# Altium integrated library Lattice CPLD ispLSI.IntLib: 471 symbols (part 3 of 26)
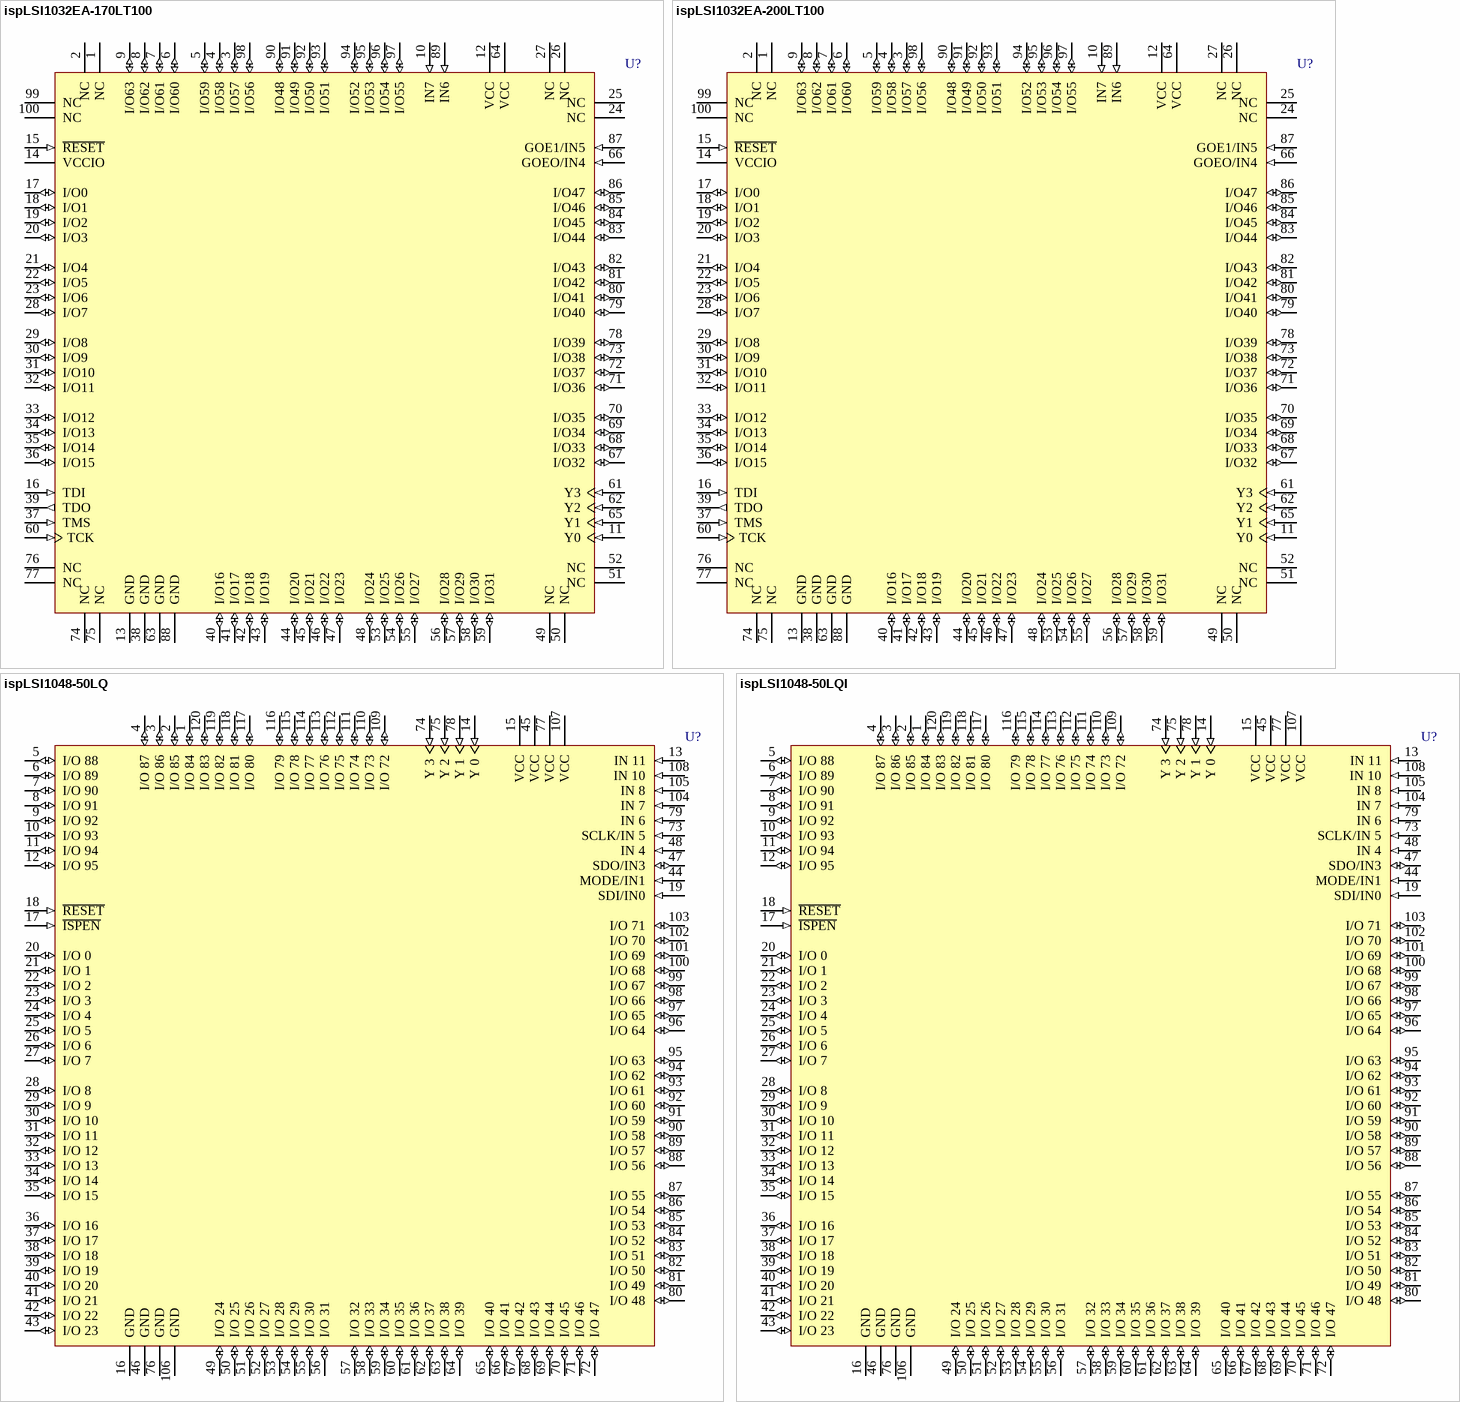
[diagram p233: symbols ispLSI1032EA-170LT100 to ispLSI1048-50LQI]

## ispLSI1032EA-200LT100
designator U?
In-System Programmable High-Density PLD; Note: Pins 66 and 87 have dual function capability which is software selectable.; Published: 23-Sep-2002; LatestRevisionDate: 13-Apr-2006; LatestRevisionNote: IPC-7351 Footprint Added.; DatasheetVersion: Jun-2000; PackageVersion: pkg_32, Aug-2005; PackageReference: TQFP100; Publisher: Altium Limited; PackageDescription: 100-Pin Thin Quad Flat Pack (TQFP100); Code_JEDEC: MS-026-BED; ComponentLink1Description: Manufacturer Link; ComponentLink1URL: http://www.latticesemi.com/products/mature/index.cfm; ComponentLink2Description: Datasheet; ComponentLink2URL: http://www.latticesemi.com/lit/docs/datasheets/cpld/1032ea.pdf
footprint TQFP100_N (Thin QFP, 100-Leads, Body 14x14mm, Pitch 0.5mm, IPC Medium Density)
footprint TQFP100_L (Thin QFP, 100-Leads, Body 14x14mm, Pitch 0.5mm, IPC High Density)
footprint TQFP100_M (Thin QFP, 100-Leads, Body 14x14mm, Pitch 0.5mm, IPC Low Density)
3D model 1032EA-TQFP100 (100-Pin Thin Quad Flat Pack (TQFP100))
pins: 1 NC, 2 NC, 3 I/O57 (io), 4 I/O58 (io), 5 I/O59 (io), 6 I/O60 (io), 7 I/O61 (io), 8 I/O62 (io), 9 I/O63 (io), 10 IN7 (in), 11 Y0 (in), 12 VCC (power), 13 GND (power), 14 VCCIO (power), 15 ~{RESET} (in), 16 TDI (in), 17 I/O0 (io), 18 I/O1 (io), 19 I/O2 (io), 20 I/O3 (io), 21 I/O4 (io), 22 I/O5 (io), 23 I/O6 (io), 24 NC, 25 NC, 26 NC, 27 NC, 28 I/O7 (io), 29 I/O8 (io), 30 I/O9 (io), 31 I/O10 (io), 32 I/O11 (io), 33 I/O12 (io), 34 I/O13 (io), 35 I/O14 (io), 36 I/O15 (io), 37 TMS (in), 38 GND (power), 39 TDO (out), 40 I/O16 (io), 41 I/O17 (io), 42 I/O18 (io), 43 I/O19 (io), 44 I/O20 (io), 45 I/O21 (io), 46 I/O22 (io), 47 I/O23 (io), 48 I/O24 (io), 49 NC, 50 NC, 51 NC, 52 NC, 53 I/O25 (io), 54 I/O26 (io), 55 I/O27 (io), 56 I/O28 (io), 57 I/O29 (io), 58 I/O30 (io), 59 I/O31 (io), 60 TCK (in), 61 Y3 (in), 62 Y2 (in), 63 GND (power), 64 VCC (power), 65 Y1 (in), 66 GOEO/IN4 (in), 67 I/O32 (io), 68 I/O33 (io), 69 I/O34 (io), 70 I/O35 (io), 71 I/O36 (io), 72 I/O37 (io), 73 I/O38 (io), 74 NC, 75 NC, 76 NC, 77 NC, 78 I/O39 (io), 79 I/O40 (io), 80 I/O41 (io), 81 I/O42 (io), 82 I/O43 (io), 83 I/O44 (io), 84 I/O45 (io), 85 I/O46 (io), 86 I/O47 (io), 87 GOE1/IN5 (in), 88 GND (power), 89 IN6 (in), 90 I/O48 (io), 91 I/O49 (io), 92 I/O50 (io), 93 I/O51 (io), 94 I/O52 (io), 95 I/O53 (io), 96 I/O54 (io), 97 I/O55 (io), 98 I/O56 (io), 99 NC, 100 NC

## ispLSI1048-50LQ
designator U?
High-Density Programmable Logic; Published: 8-Jun-2000; LatestRevisionDate: 13-Apr-2006; LatestRevisionNote: IPC-7351 Footprint Added.; DatasheetVersion: Feb-1997; PackageVersion: pkg_32, Aug-2005; PackageReference: PQFP120; Publisher: Altium Limited; PackageDescription: 120-Pin Quad Flat Pack 0.8 mm Pitch; Code_IPC: QFP80P3120X3120-120; ComponentLink1Description: Manufacturer Link; ComponentLink1URL: http://www.latticesemi.com/products/mature/index.cfm; ComponentLink2Description: Datasheet; ComponentLink2URL: http://www.latticesemi.com/lit/docs/datasheets/cpld/1048.pdf
footprint PQFP120_N (QFP, 120-Leads, Body 28x28mm, Pitch 0.8mm, IPC Medium Density)
footprint PQFP120_L (QFP, 120-Leads, Body 28x28mm, Pitch 0.8mm, IPC High Density)
footprint PQFP120_M (QFP, 120-Leads, Body 28x28mm, Pitch 0.8mm, IPC Low Density)
3D model 1048-PQFP120 (120-Pin Quad Flat Pack 0.8 mm Pitch)
pins: 1 I/O 84 (io), 2 I/O 85 (io), 3 I/O 86 (io), 4 I/O 87 (io), 5 I/O 88 (io), 6 I/O 89 (io), 7 I/O 90 (io), 8 I/O 91 (io), 9 I/O 92 (io), 10 I/O 93 (io), 11 I/O 94 (io), 12 I/O 95 (io), 13 IN 11 (in), 14 Y 0 (in), 15 VCC (power), 16 GND (power), 17 ~{ISPEN} (in), 18 ~{RESET} (in), 19 SDI/IN0 (in), 20 I/O 0 (io), 21 I/O 1 (io), 22 I/O 2 (io), 23 I/O 3 (io), 24 I/O 4 (io), 25 I/O 5 (io), 26 I/O 6 (io), 27 I/O 7 (io), 28 I/O 8 (io), 29 I/O 9 (io), 30 I/O 10 (io), 31 I/O 11 (io), 32 I/O 12 (io), 33 I/O 13 (io), 34 I/O 14 (io), 35 I/O 15 (io), 36 I/O 16 (io), 37 I/O 17 (io), 38 I/O 18 (io), 39 I/O 19 (io), 40 I/O 20 (io), 41 I/O 21 (io), 42 I/O 22 (io), 43 I/O 23 (io), 44 MODE/IN1 (in), 45 VCC (power), 46 GND (power), 47 SDO/IN3 (io), 48 IN 4 (in), 49 I/O 24 (io), 50 I/O 25 (io), 51 I/O 26 (io), 52 I/O 27 (io), 53 I/O 28 (io), 54 I/O 29 (io), 55 I/O 30 (io), 56 I/O 31 (io), 57 I/O 32 (io), 58 I/O 33 (io), 59 I/O 34 (io), 60 I/O 35 (io), 61 I/O 36 (io), 62 I/O 37 (io), 63 I/O 38 (io), 64 I/O 39 (io), 65 I/O 40 (io), 66 I/O 41 (io), 67 I/O 42 (io), 68 I/O 43 (io), 69 I/O 44 (io), 70 I/O 45 (io), 71 I/O 46 (io), 72 I/O 47 (io), 73 SCLK/IN 5 (in), 74 Y 3 (in), 75 Y 2 (in), 76 GND (power), 77 VCC (power), 78 Y 1 (in), 79 IN 6 (in), 80 I/O 48 (io), 81 I/O 49 (io), 82 I/O 50 (io), 83 I/O 51 (io), 84 I/O 52 (io), 85 I/O 53 (io), 86 I/O 54 (io), 87 I/O 55 (io), 88 I/O 56 (io), 89 I/O 57 (io), 90 I/O 58 (io), 91 I/O 59 (io), 92 I/O 60 (io), 93 I/O 61 (io), 94 I/O 62 (io), 95 I/O 63 (io), 96 I/O 64 (io), 97 I/O 65 (io), 98 I/O 66 (io), 99 I/O 67 (io), 100 I/O 68 (io), 101 I/O 69 (io), 102 I/O 70 (io), 103 I/O 71 (io), 104 IN 7 (in), 105 IN 8 (in), 106 GND (power), 107 VCC (power), 108 IN 10 (in), 109 I/O 72 (io), 110 I/O 73 (io), 111 I/O 74 (io), 112 I/O 75 (io), 113 I/O 76 (io), 114 I/O 77 (io), 115 I/O 78 (io), 116 I/O 79 (io), 117 I/O 80 (io), 118 I/O 81 (io), 119 I/O 82 (io), 120 I/O 83 (io)

## ispLSI1048-50LQI
designator U?
High-Density Programmable Logic; Published: 8-Jun-2000; LatestRevisionDate: 13-Apr-2006; LatestRevisionNote: IPC-7351 Footprint Added.; DatasheetVersion: Feb-1997; PackageVersion: pkg_32, Aug-2005; PackageReference: PQFP120; Publisher: Altium Limited; PackageDescription: 120-Pin Quad Flat Pack 0.8 mm Pitch; Code_IPC: QFP80P3120X3120-120; ComponentLink1Description: Manufacturer Link; ComponentLink1URL: http://www.latticesemi.com/products/mature/index.cfm; ComponentLink2Description: Datasheet; ComponentLink2URL: http://www.latticesemi.com/lit/docs/datasheets/cpld/1048.pdf
footprint PQFP120_N (QFP, 120-Leads, Body 28x28mm, Pitch 0.8mm, IPC Medium Density)
footprint PQFP120_L (QFP, 120-Leads, Body 28x28mm, Pitch 0.8mm, IPC High Density)
footprint PQFP120_M (QFP, 120-Leads, Body 28x28mm, Pitch 0.8mm, IPC Low Density)
3D model 1048-PQFP120 (120-Pin Quad Flat Pack 0.8 mm Pitch)
pins: 1 I/O 84 (io), 2 I/O 85 (io), 3 I/O 86 (io), 4 I/O 87 (io), 5 I/O 88 (io), 6 I/O 89 (io), 7 I/O 90 (io), 8 I/O 91 (io), 9 I/O 92 (io), 10 I/O 93 (io), 11 I/O 94 (io), 12 I/O 95 (io), 13 IN 11 (in), 14 Y 0 (in), 15 VCC (power), 16 GND (power), 17 ~{ISPEN} (in), 18 ~{RESET} (in), 19 SDI/IN0 (in), 20 I/O 0 (io), 21 I/O 1 (io), 22 I/O 2 (io), 23 I/O 3 (io), 24 I/O 4 (io), 25 I/O 5 (io), 26 I/O 6 (io), 27 I/O 7 (io), 28 I/O 8 (io), 29 I/O 9 (io), 30 I/O 10 (io), 31 I/O 11 (io), 32 I/O 12 (io), 33 I/O 13 (io), 34 I/O 14 (io), 35 I/O 15 (io), 36 I/O 16 (io), 37 I/O 17 (io), 38 I/O 18 (io), 39 I/O 19 (io), 40 I/O 20 (io), 41 I/O 21 (io), 42 I/O 22 (io), 43 I/O 23 (io), 44 MODE/IN1 (in), 45 VCC (power), 46 GND (power), 47 SDO/IN3 (io), 48 IN 4 (in), 49 I/O 24 (io), 50 I/O 25 (io), 51 I/O 26 (io), 52 I/O 27 (io), 53 I/O 28 (io), 54 I/O 29 (io), 55 I/O 30 (io), 56 I/O 31 (io), 57 I/O 32 (io), 58 I/O 33 (io), 59 I/O 34 (io), 60 I/O 35 (io), 61 I/O 36 (io), 62 I/O 37 (io), 63 I/O 38 (io), 64 I/O 39 (io), 65 I/O 40 (io), 66 I/O 41 (io), 67 I/O 42 (io), 68 I/O 43 (io), 69 I/O 44 (io), 70 I/O 45 (io), 71 I/O 46 (io), 72 I/O 47 (io), 73 SCLK/IN 5 (in), 74 Y 3 (in), 75 Y 2 (in), 76 GND (power), 77 VCC (power), 78 Y 1 (in), 79 IN 6 (in), 80 I/O 48 (io), 81 I/O 49 (io), 82 I/O 50 (io), 83 I/O 51 (io), 84 I/O 52 (io), 85 I/O 53 (io), 86 I/O 54 (io), 87 I/O 55 (io), 88 I/O 56 (io), 89 I/O 57 (io), 90 I/O 58 (io), 91 I/O 59 (io), 92 I/O 60 (io), 93 I/O 61 (io), 94 I/O 62 (io), 95 I/O 63 (io), 96 I/O 64 (io), 97 I/O 65 (io), 98 I/O 66 (io), 99 I/O 67 (io), 100 I/O 68 (io), 101 I/O 69 (io), 102 I/O 70 (io), 103 I/O 71 (io), 104 IN 7 (in), 105 IN 8 (in), 106 GND (power), 107 VCC (power), 108 IN 10 (in), 109 I/O 72 (io), 110 I/O 73 (io), 111 I/O 74 (io), 112 I/O 75 (io), 113 I/O 76 (io), 114 I/O 77 (io), 115 I/O 78 (io), 116 I/O 79 (io), 117 I/O 80 (io), 118 I/O 81 (io), 119 I/O 82 (io), 120 I/O 83 (io)

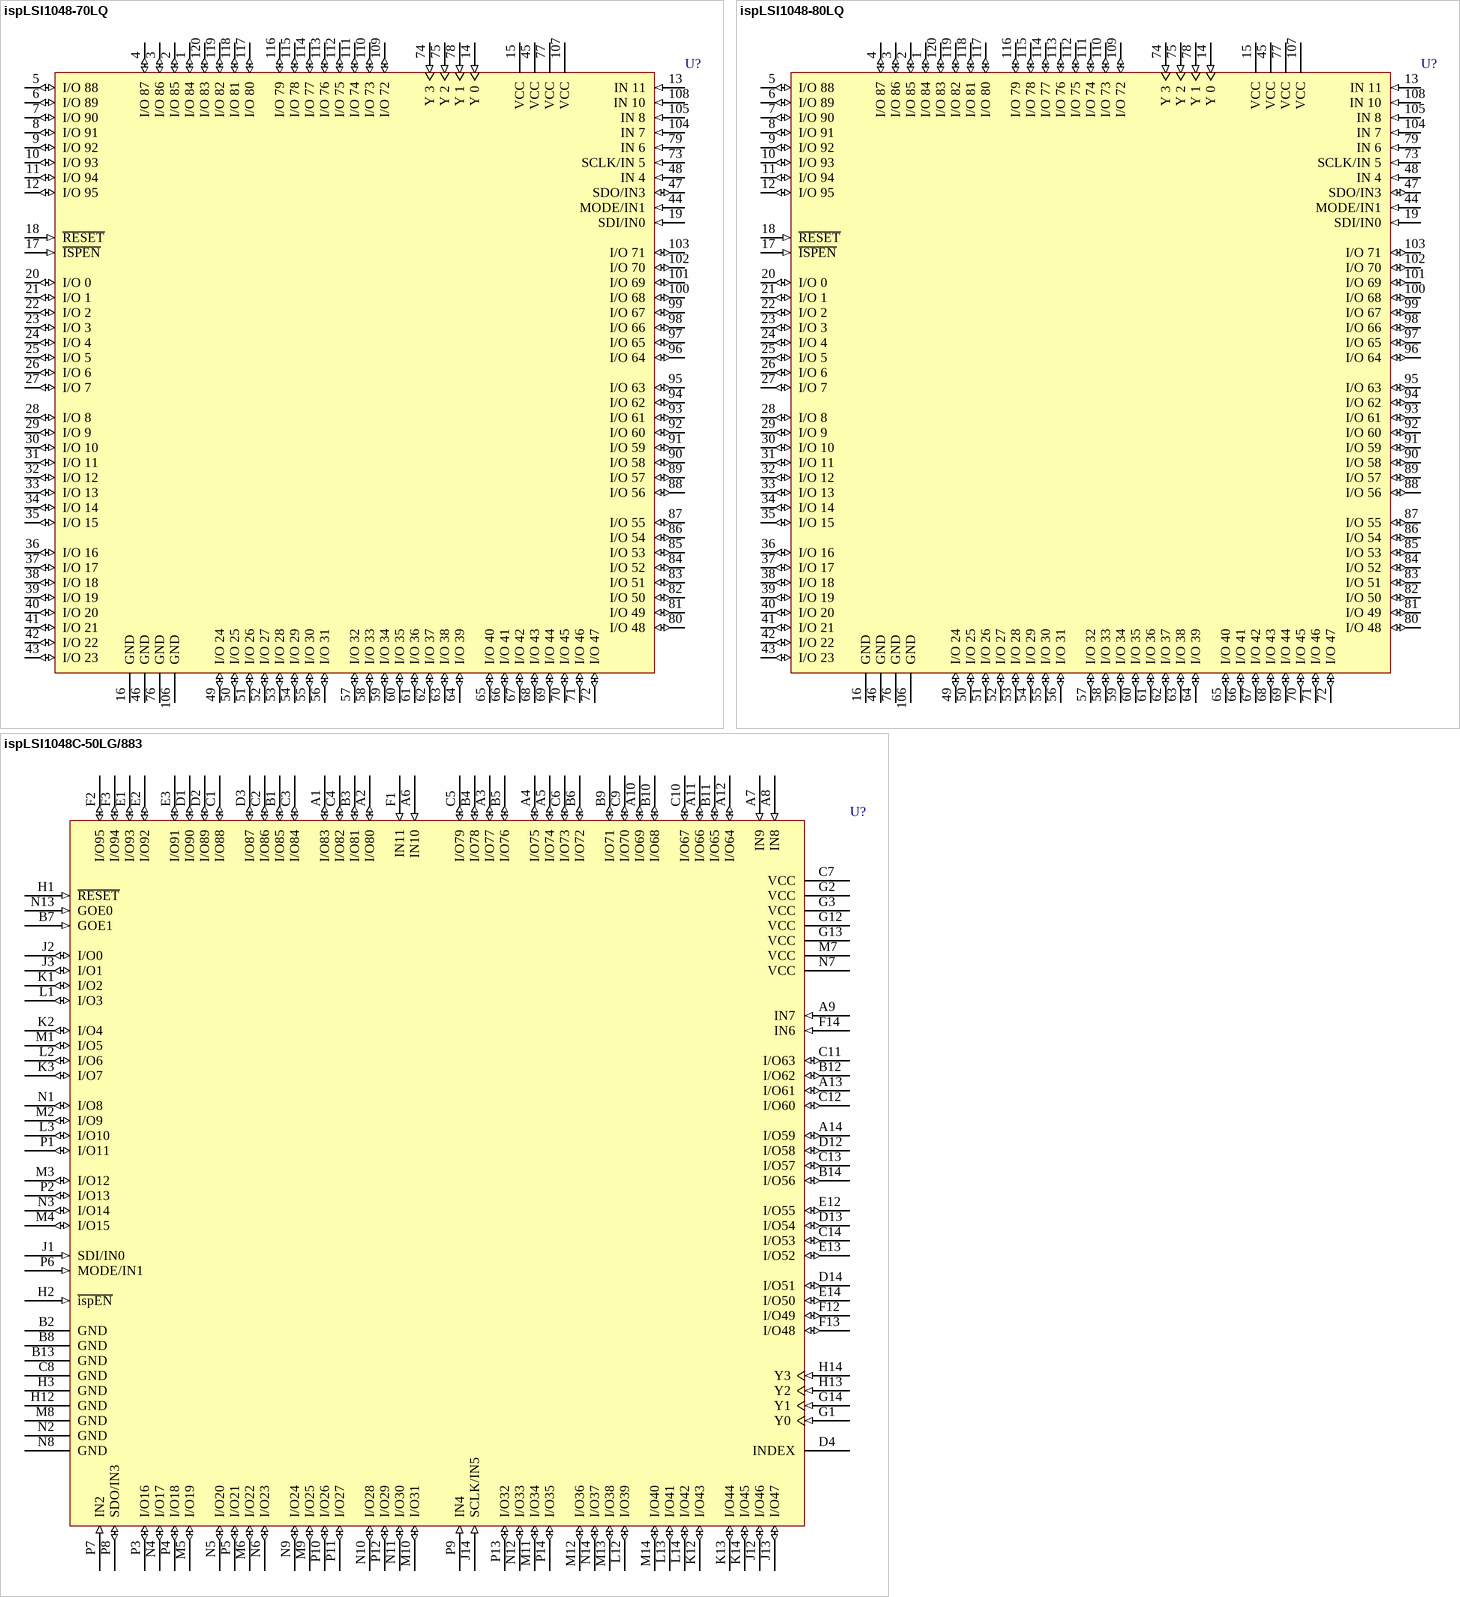
[diagram p13: symbols ispLSI1048-70LQ to ispLSI1048C-50LG/883]

## ispLSI1048-70LQ
designator U?
High-Density Programmable Logic; Published: 8-Jun-2000; LatestRevisionDate: 13-Apr-2006; LatestRevisionNote: IPC-7351 Footprint Added.; DatasheetVersion: Feb-1997; PackageVersion: pkg_32, Aug-2005; PackageReference: PQFP120; Publisher: Altium Limited; PackageDescription: 120-Pin Quad Flat Pack 0.8 mm Pitch; Code_IPC: QFP80P3120X3120-120; ComponentLink1Description: Manufacturer Link; ComponentLink1URL: http://www.latticesemi.com/products/mature/index.cfm; ComponentLink2Description: Datasheet; ComponentLink2URL: http://www.latticesemi.com/lit/docs/datasheets/cpld/1048.pdf
footprint PQFP120_N (QFP, 120-Leads, Body 28x28mm, Pitch 0.8mm, IPC Medium Density)
footprint PQFP120_L (QFP, 120-Leads, Body 28x28mm, Pitch 0.8mm, IPC High Density)
footprint PQFP120_M (QFP, 120-Leads, Body 28x28mm, Pitch 0.8mm, IPC Low Density)
3D model 1048-PQFP120 (120-Pin Quad Flat Pack 0.8 mm Pitch)
pins: 1 I/O 84 (io), 2 I/O 85 (io), 3 I/O 86 (io), 4 I/O 87 (io), 5 I/O 88 (io), 6 I/O 89 (io), 7 I/O 90 (io), 8 I/O 91 (io), 9 I/O 92 (io), 10 I/O 93 (io), 11 I/O 94 (io), 12 I/O 95 (io), 13 IN 11 (in), 14 Y 0 (in), 15 VCC (power), 16 GND (power), 17 ~{ISPEN} (in), 18 ~{RESET} (in), 19 SDI/IN0 (in), 20 I/O 0 (io), 21 I/O 1 (io), 22 I/O 2 (io), 23 I/O 3 (io), 24 I/O 4 (io), 25 I/O 5 (io), 26 I/O 6 (io), 27 I/O 7 (io), 28 I/O 8 (io), 29 I/O 9 (io), 30 I/O 10 (io), 31 I/O 11 (io), 32 I/O 12 (io), 33 I/O 13 (io), 34 I/O 14 (io), 35 I/O 15 (io), 36 I/O 16 (io), 37 I/O 17 (io), 38 I/O 18 (io), 39 I/O 19 (io), 40 I/O 20 (io), 41 I/O 21 (io), 42 I/O 22 (io), 43 I/O 23 (io), 44 MODE/IN1 (in), 45 VCC (power), 46 GND (power), 47 SDO/IN3 (io), 48 IN 4 (in), 49 I/O 24 (io), 50 I/O 25 (io), 51 I/O 26 (io), 52 I/O 27 (io), 53 I/O 28 (io), 54 I/O 29 (io), 55 I/O 30 (io), 56 I/O 31 (io), 57 I/O 32 (io), 58 I/O 33 (io), 59 I/O 34 (io), 60 I/O 35 (io), 61 I/O 36 (io), 62 I/O 37 (io), 63 I/O 38 (io), 64 I/O 39 (io), 65 I/O 40 (io), 66 I/O 41 (io), 67 I/O 42 (io), 68 I/O 43 (io), 69 I/O 44 (io), 70 I/O 45 (io), 71 I/O 46 (io), 72 I/O 47 (io), 73 SCLK/IN 5 (in), 74 Y 3 (in), 75 Y 2 (in), 76 GND (power), 77 VCC (power), 78 Y 1 (in), 79 IN 6 (in), 80 I/O 48 (io), 81 I/O 49 (io), 82 I/O 50 (io), 83 I/O 51 (io), 84 I/O 52 (io), 85 I/O 53 (io), 86 I/O 54 (io), 87 I/O 55 (io), 88 I/O 56 (io), 89 I/O 57 (io), 90 I/O 58 (io), 91 I/O 59 (io), 92 I/O 60 (io), 93 I/O 61 (io), 94 I/O 62 (io), 95 I/O 63 (io), 96 I/O 64 (io), 97 I/O 65 (io), 98 I/O 66 (io), 99 I/O 67 (io), 100 I/O 68 (io), 101 I/O 69 (io), 102 I/O 70 (io), 103 I/O 71 (io), 104 IN 7 (in), 105 IN 8 (in), 106 GND (power), 107 VCC (power), 108 IN 10 (in), 109 I/O 72 (io), 110 I/O 73 (io), 111 I/O 74 (io), 112 I/O 75 (io), 113 I/O 76 (io), 114 I/O 77 (io), 115 I/O 78 (io), 116 I/O 79 (io), 117 I/O 80 (io), 118 I/O 81 (io), 119 I/O 82 (io), 120 I/O 83 (io)

## ispLSI1048-80LQ
designator U?
High-Density Programmable Logic; Published: 8-Jun-2000; LatestRevisionDate: 13-Apr-2006; LatestRevisionNote: IPC-7351 Footprint Added.; DatasheetVersion: Feb-1997; PackageVersion: pkg_32, Aug-2005; PackageReference: PQFP120; Publisher: Altium Limited; PackageDescription: 120-Pin Quad Flat Pack 0.8 mm Pitch; Code_IPC: QFP80P3120X3120-120; ComponentLink1Description: Manufacturer Link; ComponentLink1URL: http://www.latticesemi.com/products/mature/index.cfm; ComponentLink2Description: Datasheet; ComponentLink2URL: http://www.latticesemi.com/lit/docs/datasheets/cpld/1048.pdf
footprint PQFP120_N (QFP, 120-Leads, Body 28x28mm, Pitch 0.8mm, IPC Medium Density)
footprint PQFP120_L (QFP, 120-Leads, Body 28x28mm, Pitch 0.8mm, IPC High Density)
footprint PQFP120_M (QFP, 120-Leads, Body 28x28mm, Pitch 0.8mm, IPC Low Density)
3D model 1048-PQFP120 (120-Pin Quad Flat Pack 0.8 mm Pitch)
pins: 1 I/O 84 (io), 2 I/O 85 (io), 3 I/O 86 (io), 4 I/O 87 (io), 5 I/O 88 (io), 6 I/O 89 (io), 7 I/O 90 (io), 8 I/O 91 (io), 9 I/O 92 (io), 10 I/O 93 (io), 11 I/O 94 (io), 12 I/O 95 (io), 13 IN 11 (in), 14 Y 0 (in), 15 VCC (power), 16 GND (power), 17 ~{ISPEN} (in), 18 ~{RESET} (in), 19 SDI/IN0 (in), 20 I/O 0 (io), 21 I/O 1 (io), 22 I/O 2 (io), 23 I/O 3 (io), 24 I/O 4 (io), 25 I/O 5 (io), 26 I/O 6 (io), 27 I/O 7 (io), 28 I/O 8 (io), 29 I/O 9 (io), 30 I/O 10 (io), 31 I/O 11 (io), 32 I/O 12 (io), 33 I/O 13 (io), 34 I/O 14 (io), 35 I/O 15 (io), 36 I/O 16 (io), 37 I/O 17 (io), 38 I/O 18 (io), 39 I/O 19 (io), 40 I/O 20 (io), 41 I/O 21 (io), 42 I/O 22 (io), 43 I/O 23 (io), 44 MODE/IN1 (in), 45 VCC (power), 46 GND (power), 47 SDO/IN3 (io), 48 IN 4 (in), 49 I/O 24 (io), 50 I/O 25 (io), 51 I/O 26 (io), 52 I/O 27 (io), 53 I/O 28 (io), 54 I/O 29 (io), 55 I/O 30 (io), 56 I/O 31 (io), 57 I/O 32 (io), 58 I/O 33 (io), 59 I/O 34 (io), 60 I/O 35 (io), 61 I/O 36 (io), 62 I/O 37 (io), 63 I/O 38 (io), 64 I/O 39 (io), 65 I/O 40 (io), 66 I/O 41 (io), 67 I/O 42 (io), 68 I/O 43 (io), 69 I/O 44 (io), 70 I/O 45 (io), 71 I/O 46 (io), 72 I/O 47 (io), 73 SCLK/IN 5 (in), 74 Y 3 (in), 75 Y 2 (in), 76 GND (power), 77 VCC (power), 78 Y 1 (in), 79 IN 6 (in), 80 I/O 48 (io), 81 I/O 49 (io), 82 I/O 50 (io), 83 I/O 51 (io), 84 I/O 52 (io), 85 I/O 53 (io), 86 I/O 54 (io), 87 I/O 55 (io), 88 I/O 56 (io), 89 I/O 57 (io), 90 I/O 58 (io), 91 I/O 59 (io), 92 I/O 60 (io), 93 I/O 61 (io), 94 I/O 62 (io), 95 I/O 63 (io), 96 I/O 64 (io), 97 I/O 65 (io), 98 I/O 66 (io), 99 I/O 67 (io), 100 I/O 68 (io), 101 I/O 69 (io), 102 I/O 70 (io), 103 I/O 71 (io), 104 IN 7 (in), 105 IN 8 (in), 106 GND (power), 107 VCC (power), 108 IN 10 (in), 109 I/O 72 (io), 110 I/O 73 (io), 111 I/O 74 (io), 112 I/O 75 (io), 113 I/O 76 (io), 114 I/O 77 (io), 115 I/O 78 (io), 116 I/O 79 (io), 117 I/O 80 (io), 118 I/O 81 (io), 119 I/O 82 (io), 120 I/O 83 (io)

## ispLSI1048C-50LG/883
designator U?
In-System Programmable High-Density PLD; Note: Pins J1, P6, P8 and J14 have dual function capability.; Published: 23-Sep-2002; LatestRevisionDate: 04-Mar-2005; LatestRevisionNote: Stylized 3D Model Added.; DatasheetVersion: Mar-1993; PackageVersion: pkg_32, Aug-2005; PackageReference: CPGA133; Publisher: Altium Limited; PackageDescription: 133-Pin Pin Grid Array 2.54 mm Pitch; ComponentLink1Description: Manufacturer Link; ComponentLink1URL: http://www.latticesemi.com/products/mature/index.cfm; ComponentLink2Description: Datasheet; ComponentLink2URL: http://www.latticesemi.com/lit/docs/military/1048c.pdf
footprint CPGA133 (PGA, 133-Leads, Body 37x37mm, Pitch 2.54mm)
3D model 1048C-CPGA133 (133-Pin Pin Grid Array 2.54 mm Pitch)
pins: A1 I/O83 (io), A2 I/O80 (io), A3 I/O77 (io), A4 I/O75 (io), A5 I/O74 (io), A6 IN10 (in), A7 IN9 (in), A8 IN8 (in), A9 IN7 (in), A10 I/O69 (io), A11 I/O66 (io), A12 I/O64 (io), A13 I/O61 (io), A14 I/O59 (io), B1 I/O85 (io), B2 GND (power), B3 I/O81 (io), B4 I/O78 (io), B5 I/O76 (io), B6 I/O72 (io), B7 GOE1 (in), B8 GND (power), B9 I/O71 (io), B10 I/O68 (io), B11 I/O65 (io), B12 I/O62 (io), B13 GND (power), B14 I/O56 (io), C1 I/O88 (io), C2 I/O86 (io), C3 I/O84 (io), C4 I/O82 (io), C5 I/O79 (io), C6 I/O73 (io), C7 VCC (power), C8 GND (power), C9 I/O70 (io), C10 I/O67 (io), C11 I/O63 (io), C12 I/O60 (io), C13 I/O57 (io), C14 I/O53 (io), D1 I/O90 (io), D2 I/O89 (io), D3 I/O87 (io), D4 INDEX, D12 I/O58 (io), D13 I/O54 (io), D14 I/O51 (io), E1 I/O93 (io), E2 I/O92 (io), E3 I/O91 (io), E12 I/O55 (io), E13 I/O52 (io), E14 I/O50 (io), F1 IN11 (in), F2 I/O95 (io), F3 I/O94 (io), F12 I/O49 (io), F13 I/O48 (io), F14 IN6 (in), G1 Y0 (in), G2 VCC (power), G3 VCC (power), G12 VCC (power), G13 VCC (power), G14 Y1 (in), H1 ~{RESET} (in), H2 ~{ispEN} (in), H3 GND (power), H12 GND (power), H13 Y2 (in), H14 Y3 (in), J1 SDI/IN0 (in), J2 I/O0 (io), J3 I/O1 (io), J12 I/O46 (io), J13 I/O47 (io), J14 SCLK/IN5 (in), K1 I/O2 (io), K2 I/O4 (io), K3 I/O7 (io), K12 I/O43 (io), K13 I/O44 (io), K14 I/O45 (io), L1 I/O3 (io), L2 I/O6 (io), L3 I/O10 (io), L12 I/O39 (io), L13 I/O41 (io), L14 I/O42 (io), M1 I/O5 (io), M2 I/O9 (io), M3 I/O12 (io), M4 I/O15 (io), M5 I/O19 (io), M6 I/O22 (io), M7 VCC (power), M8 GND (power), M9 I/O25 (io), M10 I/O31 (io), M11 I/O34 (io), M12 I/O36 (io), M13 I/O38 (io), M14 I/O40 (io), N1 I/O8 (io), N2 GND (power), N3 I/O14 (io), N4 I/O17 (io), N5 I/O20 (io), N6 I/O23 (io), N7 VCC (power), N8 GND (power), N9 I/O24 (io), N10 I/O28 (io), N11 I/O30 (io), N12 I/O33 (io), N13 GOE0 (in), N14 I/O37 (io), P1 I/O11 (io), P2 I/O13 (io), P3 I/O16 (io), P4 I/O18 (io), P5 I/O21 (io), P6 MODE/IN1 (in), P7 IN2 (in), P8 SDO/IN3 (io), P9 IN4 (in), P10 I/O26 (io), P11 I/O27 (io), P12 I/O29 (io), P13 I/O32 (io), P14 I/O35 (io)

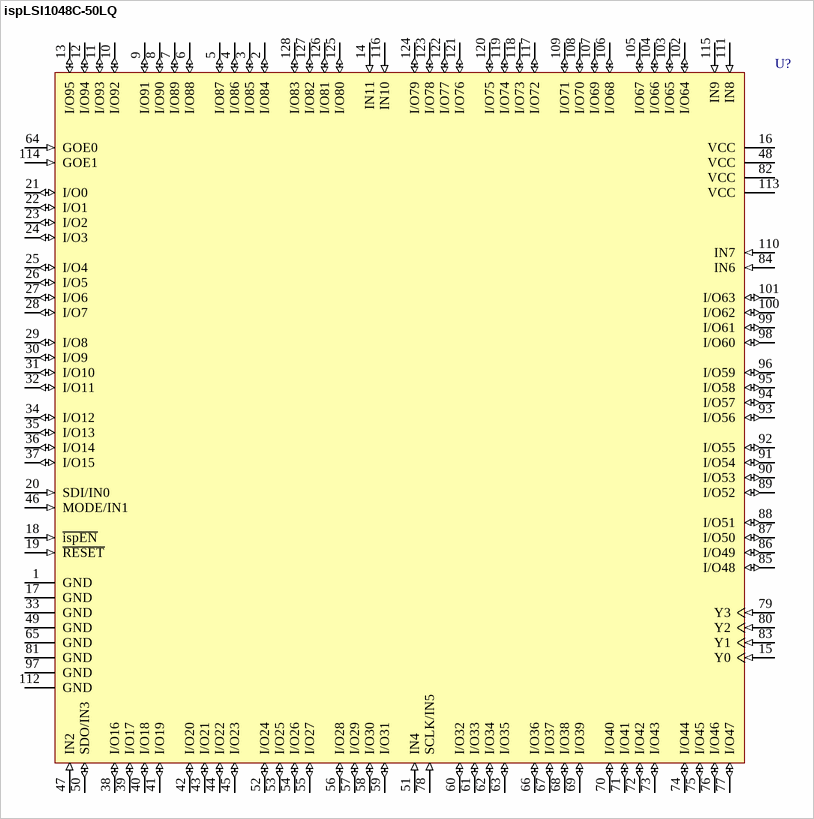
[diagram p14: symbol ispLSI1048C-50LQ]

## ispLSI1048C-50LQ
designator U?
In-System Programmable High-Density PLD; Note: Pins 20, 46, 50 and 78 have dual function capability.; Published: 23-Sep-2002; LatestRevisionDate: 13-Apr-2006; LatestRevisionNote: IPC-7351 Footprint Added.; DatasheetVersion: Mar-1993; PackageVersion: pkg_32, Aug-2005; PackageReference: PQFP128; Publisher: Altium Limited; PackageDescription: 128-Pin Quad Flat Pack 0.8 mm Pitch; Code_IPC: QFP80P3120X3120-128; ComponentLink1Description: Manufacturer Link; ComponentLink1URL: http://www.latticesemi.com/products/mature/index.cfm; ComponentLink2Description: Datasheet; ComponentLink2URL: http://www.latticesemi.com/lit/docs/datasheets/cpld/1048c.pdf
footprint PQFP128_N (QFP, 128-Leads, Body 28x28mm, Pitch 0.8mm, IPC Medium Density)
footprint PQFP128_L (QFP, 128-Leads, Body 28x28mm, Pitch 0.8mm, IPC High Density)
footprint PQFP128_M (QFP, 128-Leads, Body 28x28mm, Pitch 0.8mm, IPC Low Density)
3D model 1048C-PQFP128 (128-Pin Quad Flat Pack 0.8 mm Pitch)
pins: 1 GND (power), 2 I/O84 (io), 3 I/O85 (io), 4 I/O86 (io), 5 I/O87 (io), 6 I/O88 (io), 7 I/O89 (io), 8 I/O90 (io), 9 I/O91 (io), 10 I/O92 (io), 11 I/O93 (io), 12 I/O94 (io), 13 I/O95 (io), 14 IN11 (in), 15 Y0 (in), 16 VCC (power), 17 GND (power), 18 ~{ispEN} (in), 19 ~{RESET} (in), 20 SDI/IN0 (in), 21 I/O0 (io), 22 I/O1 (io), 23 I/O2 (io), 24 I/O3 (io), 25 I/O4 (io), 26 I/O5 (io), 27 I/O6 (io), 28 I/O7 (io), 29 I/O8 (io), 30 I/O9 (io), 31 I/O10 (io), 32 I/O11 (io), 33 GND (power), 34 I/O12 (io), 35 I/O13 (io), 36 I/O14 (io), 37 I/O15 (io), 38 I/O16 (io), 39 I/O17 (io), 40 I/O18 (io), 41 I/O19 (io), 42 I/O20 (io), 43 I/O21 (io), 44 I/O22 (io), 45 I/O23 (io), 46 MODE/IN1 (in), 47 IN2 (in), 48 VCC (power), 49 GND (power), 50 SDO/IN3 (io), 51 IN4 (in), 52 I/O24 (io), 53 I/O25 (io), 54 I/O26 (io), 55 I/O27 (io), 56 I/O28 (io), 57 I/O29 (io), 58 I/O30 (io), 59 I/O31 (io), 60 I/O32 (io), 61 I/O33 (io), 62 I/O34 (io), 63 I/O35 (io), 64 GOE0 (in), 65 GND (power), 66 I/O36 (io), 67 I/O37 (io), 68 I/O38 (io), 69 I/O39 (io), 70 I/O40 (io), 71 I/O41 (io), 72 I/O42 (io), 73 I/O43 (io), 74 I/O44 (io), 75 I/O45 (io), 76 I/O46 (io), 77 I/O47 (io), 78 SCLK/IN5 (in), 79 Y3 (in), 80 Y2 (in), 81 GND (power), 82 VCC (power), 83 Y1 (in), 84 IN6 (in), 85 I/O48 (io), 86 I/O49 (io), 87 I/O50 (io), 88 I/O51 (io), 89 I/O52 (io), 90 I/O53 (io), 91 I/O54 (io), 92 I/O55 (io), 93 I/O56 (io), 94 I/O57 (io), 95 I/O58 (io), 96 I/O59 (io), 97 GND (power), 98 I/O60 (io), 99 I/O61 (io), 100 I/O62 (io), 101 I/O63 (io), 102 I/O64 (io), 103 I/O65 (io), 104 I/O66 (io), 105 I/O67 (io), 106 I/O68 (io), 107 I/O69 (io), 108 I/O70 (io), 109 I/O71 (io), 110 IN7 (in), 111 IN8 (in), 112 GND (power), 113 VCC (power), 114 GOE1 (in), 115 IN9 (in), 116 IN10 (in), 117 I/O72 (io), 118 I/O73 (io), 119 I/O74 (io), 120 I/O75 (io), 121 I/O76 (io), 122 I/O77 (io), 123 I/O78 (io), 124 I/O79 (io), 125 I/O80 (io), 126 I/O81 (io), 127 I/O82 (io), 128 I/O83 (io)

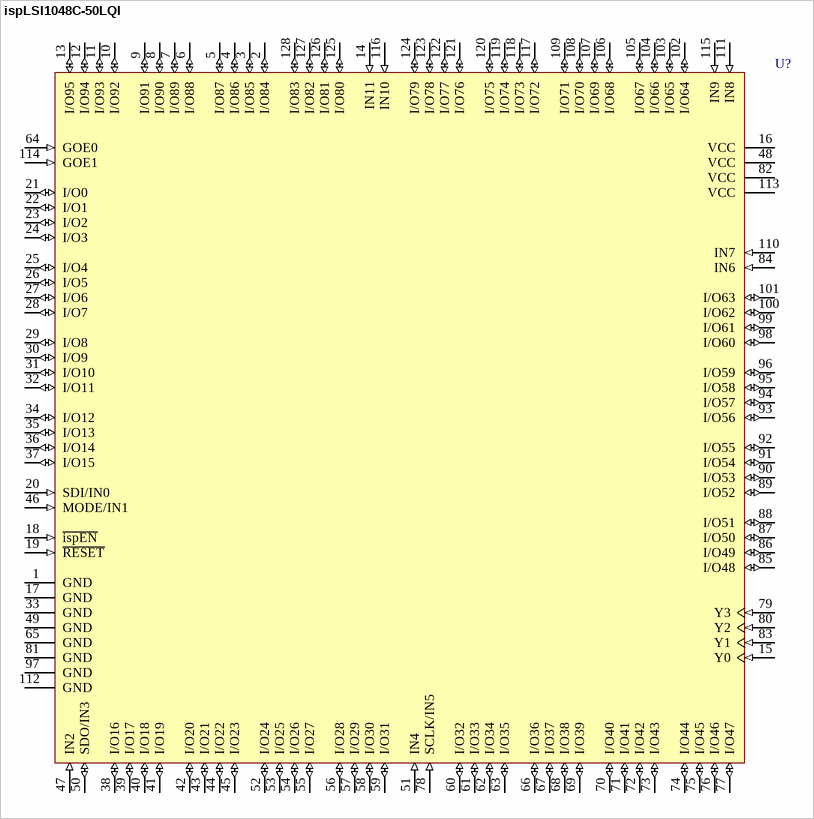
[diagram p15: symbol ispLSI1048C-50LQI]

## ispLSI1048C-50LQI
designator U?
In-System Programmable High-Density PLD; Note: Pins 20, 46, 50 and 78 have dual function capability.; Published: 23-Sep-2002; LatestRevisionDate: 13-Apr-2006; LatestRevisionNote: IPC-7351 Footprint Added.; DatasheetVersion: Mar-1993; PackageVersion: pkg_32, Aug-2005; PackageReference: PQFP128; Publisher: Altium Limited; PackageDescription: 128-Pin Quad Flat Pack 0.8 mm Pitch; Code_IPC: QFP80P3120X3120-128; ComponentLink1Description: Manufacturer Link; ComponentLink1URL: http://www.latticesemi.com/products/mature/index.cfm; ComponentLink2Description: Datasheet; ComponentLink2URL: http://www.latticesemi.com/lit/docs/datasheets/cpld/1048c.pdf
footprint PQFP128_N (QFP, 128-Leads, Body 28x28mm, Pitch 0.8mm, IPC Medium Density)
footprint PQFP128_L (QFP, 128-Leads, Body 28x28mm, Pitch 0.8mm, IPC High Density)
footprint PQFP128_M (QFP, 128-Leads, Body 28x28mm, Pitch 0.8mm, IPC Low Density)
3D model 1048C-PQFP128 (128-Pin Quad Flat Pack 0.8 mm Pitch)
pins: 1 GND (power), 2 I/O84 (io), 3 I/O85 (io), 4 I/O86 (io), 5 I/O87 (io), 6 I/O88 (io), 7 I/O89 (io), 8 I/O90 (io), 9 I/O91 (io), 10 I/O92 (io), 11 I/O93 (io), 12 I/O94 (io), 13 I/O95 (io), 14 IN11 (in), 15 Y0 (in), 16 VCC (power), 17 GND (power), 18 ~{ispEN} (in), 19 ~{RESET} (in), 20 SDI/IN0 (in), 21 I/O0 (io), 22 I/O1 (io), 23 I/O2 (io), 24 I/O3 (io), 25 I/O4 (io), 26 I/O5 (io), 27 I/O6 (io), 28 I/O7 (io), 29 I/O8 (io), 30 I/O9 (io), 31 I/O10 (io), 32 I/O11 (io), 33 GND (power), 34 I/O12 (io), 35 I/O13 (io), 36 I/O14 (io), 37 I/O15 (io), 38 I/O16 (io), 39 I/O17 (io), 40 I/O18 (io), 41 I/O19 (io), 42 I/O20 (io), 43 I/O21 (io), 44 I/O22 (io), 45 I/O23 (io), 46 MODE/IN1 (in), 47 IN2 (in), 48 VCC (power), 49 GND (power), 50 SDO/IN3 (io), 51 IN4 (in), 52 I/O24 (io), 53 I/O25 (io), 54 I/O26 (io), 55 I/O27 (io), 56 I/O28 (io), 57 I/O29 (io), 58 I/O30 (io), 59 I/O31 (io), 60 I/O32 (io), 61 I/O33 (io), 62 I/O34 (io), 63 I/O35 (io), 64 GOE0 (in), 65 GND (power), 66 I/O36 (io), 67 I/O37 (io), 68 I/O38 (io), 69 I/O39 (io), 70 I/O40 (io), 71 I/O41 (io), 72 I/O42 (io), 73 I/O43 (io), 74 I/O44 (io), 75 I/O45 (io), 76 I/O46 (io), 77 I/O47 (io), 78 SCLK/IN5 (in), 79 Y3 (in), 80 Y2 (in), 81 GND (power), 82 VCC (power), 83 Y1 (in), 84 IN6 (in), 85 I/O48 (io), 86 I/O49 (io), 87 I/O50 (io), 88 I/O51 (io), 89 I/O52 (io), 90 I/O53 (io), 91 I/O54 (io), 92 I/O55 (io), 93 I/O56 (io), 94 I/O57 (io), 95 I/O58 (io), 96 I/O59 (io), 97 GND (power), 98 I/O60 (io), 99 I/O61 (io), 100 I/O62 (io), 101 I/O63 (io), 102 I/O64 (io), 103 I/O65 (io), 104 I/O66 (io), 105 I/O67 (io), 106 I/O68 (io), 107 I/O69 (io), 108 I/O70 (io), 109 I/O71 (io), 110 IN7 (in), 111 IN8 (in), 112 GND (power), 113 VCC (power), 114 GOE1 (in), 115 IN9 (in), 116 IN10 (in), 117 I/O72 (io), 118 I/O73 (io), 119 I/O74 (io), 120 I/O75 (io), 121 I/O76 (io), 122 I/O77 (io), 123 I/O78 (io), 124 I/O79 (io), 125 I/O80 (io), 126 I/O81 (io), 127 I/O82 (io), 128 I/O83 (io)

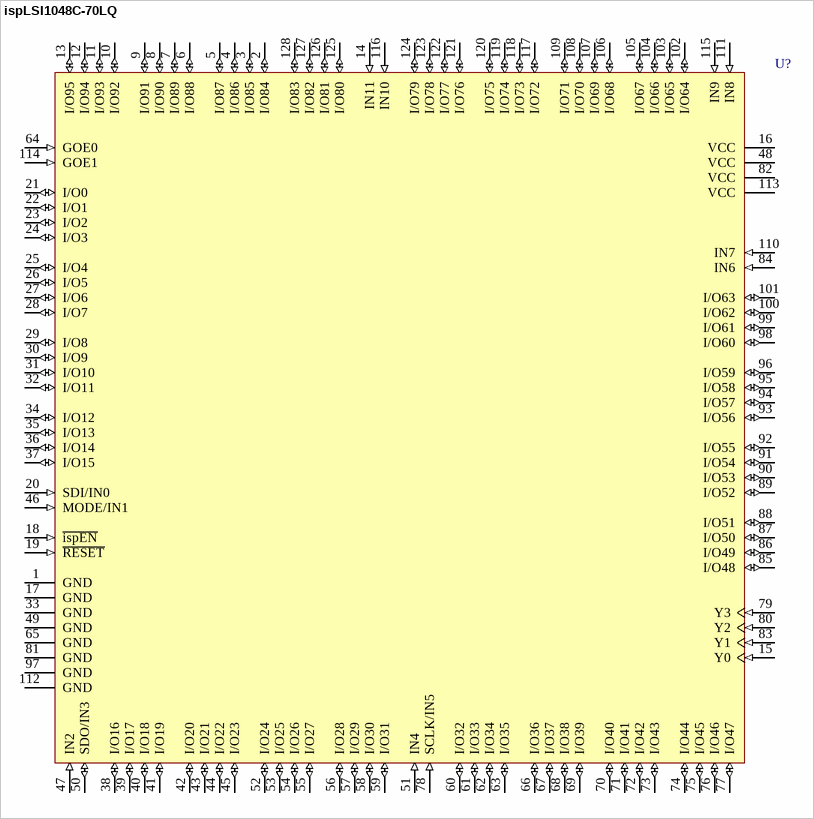
[diagram p16: symbol ispLSI1048C-70LQ]

## ispLSI1048C-70LQ
designator U?
In-System Programmable High-Density PLD; Note: Pins 20, 46, 50 and 78 have dual function capability.; Published: 23-Sep-2002; LatestRevisionDate: 13-Apr-2006; LatestRevisionNote: IPC-7351 Footprint Added.; DatasheetVersion: Mar-1993; PackageVersion: pkg_32, Aug-2005; PackageReference: PQFP128; Publisher: Altium Limited; PackageDescription: 128-Pin Quad Flat Pack 0.8 mm Pitch; Code_IPC: QFP80P3120X3120-128; ComponentLink1Description: Manufacturer Link; ComponentLink1URL: http://www.latticesemi.com/products/mature/index.cfm; ComponentLink2Description: Datasheet; ComponentLink2URL: http://www.latticesemi.com/lit/docs/datasheets/cpld/1048c.pdf
footprint PQFP128_N (QFP, 128-Leads, Body 28x28mm, Pitch 0.8mm, IPC Medium Density)
footprint PQFP128_L (QFP, 128-Leads, Body 28x28mm, Pitch 0.8mm, IPC High Density)
footprint PQFP128_M (QFP, 128-Leads, Body 28x28mm, Pitch 0.8mm, IPC Low Density)
3D model 1048C-PQFP128 (128-Pin Quad Flat Pack 0.8 mm Pitch)
pins: 1 GND (power), 2 I/O84 (io), 3 I/O85 (io), 4 I/O86 (io), 5 I/O87 (io), 6 I/O88 (io), 7 I/O89 (io), 8 I/O90 (io), 9 I/O91 (io), 10 I/O92 (io), 11 I/O93 (io), 12 I/O94 (io), 13 I/O95 (io), 14 IN11 (in), 15 Y0 (in), 16 VCC (power), 17 GND (power), 18 ~{ispEN} (in), 19 ~{RESET} (in), 20 SDI/IN0 (in), 21 I/O0 (io), 22 I/O1 (io), 23 I/O2 (io), 24 I/O3 (io), 25 I/O4 (io), 26 I/O5 (io), 27 I/O6 (io), 28 I/O7 (io), 29 I/O8 (io), 30 I/O9 (io), 31 I/O10 (io), 32 I/O11 (io), 33 GND (power), 34 I/O12 (io), 35 I/O13 (io), 36 I/O14 (io), 37 I/O15 (io), 38 I/O16 (io), 39 I/O17 (io), 40 I/O18 (io), 41 I/O19 (io), 42 I/O20 (io), 43 I/O21 (io), 44 I/O22 (io), 45 I/O23 (io), 46 MODE/IN1 (in), 47 IN2 (in), 48 VCC (power), 49 GND (power), 50 SDO/IN3 (io), 51 IN4 (in), 52 I/O24 (io), 53 I/O25 (io), 54 I/O26 (io), 55 I/O27 (io), 56 I/O28 (io), 57 I/O29 (io), 58 I/O30 (io), 59 I/O31 (io), 60 I/O32 (io), 61 I/O33 (io), 62 I/O34 (io), 63 I/O35 (io), 64 GOE0 (in), 65 GND (power), 66 I/O36 (io), 67 I/O37 (io), 68 I/O38 (io), 69 I/O39 (io), 70 I/O40 (io), 71 I/O41 (io), 72 I/O42 (io), 73 I/O43 (io), 74 I/O44 (io), 75 I/O45 (io), 76 I/O46 (io), 77 I/O47 (io), 78 SCLK/IN5 (in), 79 Y3 (in), 80 Y2 (in), 81 GND (power), 82 VCC (power), 83 Y1 (in), 84 IN6 (in), 85 I/O48 (io), 86 I/O49 (io), 87 I/O50 (io), 88 I/O51 (io), 89 I/O52 (io), 90 I/O53 (io), 91 I/O54 (io), 92 I/O55 (io), 93 I/O56 (io), 94 I/O57 (io), 95 I/O58 (io), 96 I/O59 (io), 97 GND (power), 98 I/O60 (io), 99 I/O61 (io), 100 I/O62 (io), 101 I/O63 (io), 102 I/O64 (io), 103 I/O65 (io), 104 I/O66 (io), 105 I/O67 (io), 106 I/O68 (io), 107 I/O69 (io), 108 I/O70 (io), 109 I/O71 (io), 110 IN7 (in), 111 IN8 (in), 112 GND (power), 113 VCC (power), 114 GOE1 (in), 115 IN9 (in), 116 IN10 (in), 117 I/O72 (io), 118 I/O73 (io), 119 I/O74 (io), 120 I/O75 (io), 121 I/O76 (io), 122 I/O77 (io), 123 I/O78 (io), 124 I/O79 (io), 125 I/O80 (io), 126 I/O81 (io), 127 I/O82 (io), 128 I/O83 (io)

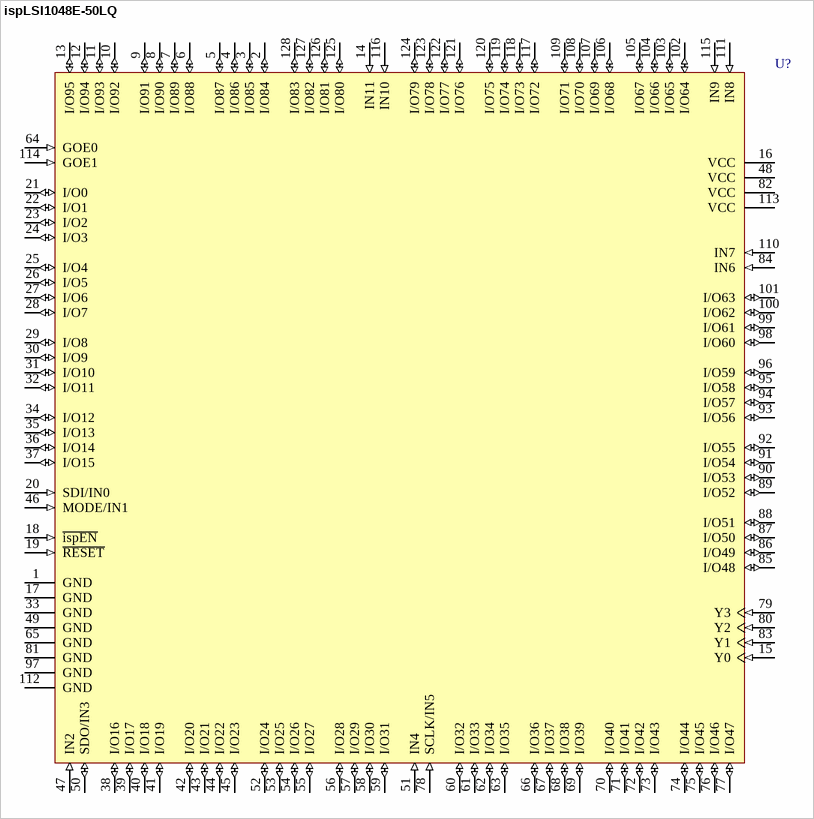
[diagram p17: symbol ispLSI1048E-50LQ]

## ispLSI1048E-50LQ
designator U?
In-System Programmable High-Density PLD; Note: Pins 20, 46, 50 and 78 have dual function capability.; Published: 23-Sep-2002; LatestRevisionDate: 13-Apr-2006; LatestRevisionNote: IPC-7351 Footprint Added.; DatasheetVersion: Oct-1998; PackageVersion: pkg_32, Aug-2005; PackageReference: PQFP128; Publisher: Altium Limited; PackageDescription: 128-Pin Quad Flat Pack 0.8 mm Pitch; Code_IPC: QFP80P3120X3120-128; ComponentLink1Description: Manufacturer Link; ComponentLink1URL: http://www.latticesemi.com/products/mature/index.cfm; ComponentLink2Description: Datasheet; ComponentLink2URL: http://www.latticesemi.com/lit/docs/datasheets/cpld/1048e.pdf
footprint PQFP128_N (QFP, 128-Leads, Body 28x28mm, Pitch 0.8mm, IPC Medium Density)
footprint PQFP128_L (QFP, 128-Leads, Body 28x28mm, Pitch 0.8mm, IPC High Density)
footprint PQFP128_M (QFP, 128-Leads, Body 28x28mm, Pitch 0.8mm, IPC Low Density)
3D model 1048E-PQFP128 (128-Pin Quad Flat Pack 0.8 mm Pitch)
pins: 1 GND (power), 2 I/O84 (io), 3 I/O85 (io), 4 I/O86 (io), 5 I/O87 (io), 6 I/O88 (io), 7 I/O89 (io), 8 I/O90 (io), 9 I/O91 (io), 10 I/O92 (io), 11 I/O93 (io), 12 I/O94 (io), 13 I/O95 (io), 14 IN11 (in), 15 Y0 (in), 16 VCC (power), 17 GND (power), 18 ~{ispEN} (in), 19 ~{RESET} (in), 20 SDI/IN0 (in), 21 I/O0 (io), 22 I/O1 (io), 23 I/O2 (io), 24 I/O3 (io), 25 I/O4 (io), 26 I/O5 (io), 27 I/O6 (io), 28 I/O7 (io), 29 I/O8 (io), 30 I/O9 (io), 31 I/O10 (io), 32 I/O11 (io), 33 GND (power), 34 I/O12 (io), 35 I/O13 (io), 36 I/O14 (io), 37 I/O15 (io), 38 I/O16 (io), 39 I/O17 (io), 40 I/O18 (io), 41 I/O19 (io), 42 I/O20 (io), 43 I/O21 (io), 44 I/O22 (io), 45 I/O23 (io), 46 MODE/IN1 (in), 47 IN2 (in), 48 VCC (power), 49 GND (power), 50 SDO/IN3 (io), 51 IN4 (in), 52 I/O24 (io), 53 I/O25 (io), 54 I/O26 (io), 55 I/O27 (io), 56 I/O28 (io), 57 I/O29 (io), 58 I/O30 (io), 59 I/O31 (io), 60 I/O32 (io), 61 I/O33 (io), 62 I/O34 (io), 63 I/O35 (io), 64 GOE0 (in), 65 GND (power), 66 I/O36 (io), 67 I/O37 (io), 68 I/O38 (io), 69 I/O39 (io), 70 I/O40 (io), 71 I/O41 (io), 72 I/O42 (io), 73 I/O43 (io), 74 I/O44 (io), 75 I/O45 (io), 76 I/O46 (io), 77 I/O47 (io), 78 SCLK/IN5 (in), 79 Y3 (in), 80 Y2 (in), 81 GND (power), 82 VCC (power), 83 Y1 (in), 84 IN6 (in), 85 I/O48 (io), 86 I/O49 (io), 87 I/O50 (io), 88 I/O51 (io), 89 I/O52 (io), 90 I/O53 (io), 91 I/O54 (io), 92 I/O55 (io), 93 I/O56 (io), 94 I/O57 (io), 95 I/O58 (io), 96 I/O59 (io), 97 GND (power), 98 I/O60 (io), 99 I/O61 (io), 100 I/O62 (io), 101 I/O63 (io), 102 I/O64 (io), 103 I/O65 (io), 104 I/O66 (io), 105 I/O67 (io), 106 I/O68 (io), 107 I/O69 (io), 108 I/O70 (io), 109 I/O71 (io), 110 IN7 (in), 111 IN8 (in), 112 GND (power), 113 VCC (power), 114 GOE1 (in), 115 IN9 (in), 116 IN10 (in), 117 I/O72 (io), 118 I/O73 (io), 119 I/O74 (io), 120 I/O75 (io), 121 I/O76 (io), 122 I/O77 (io), 123 I/O78 (io), 124 I/O79 (io), 125 I/O80 (io), 126 I/O81 (io), 127 I/O82 (io), 128 I/O83 (io)

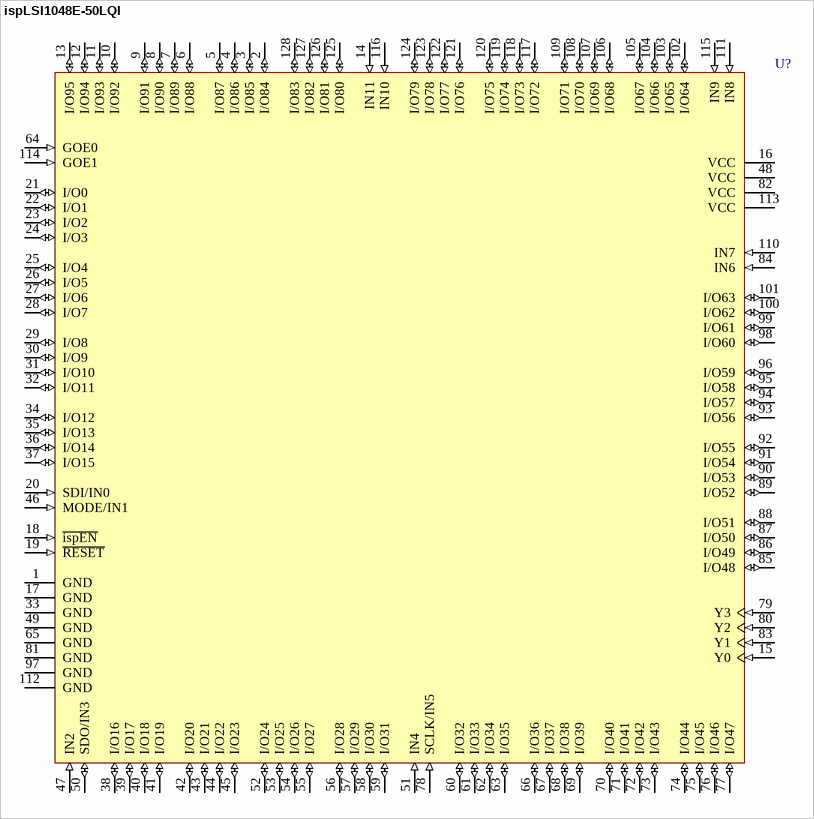
[diagram p18: symbol ispLSI1048E-50LQI]

## ispLSI1048E-50LQI
designator U?
In-System Programmable High-Density PLD; Note: Pins 20, 46, 50 and 78 have dual function capability.; Published: 23-Sep-2002; LatestRevisionDate: 13-Apr-2006; LatestRevisionNote: IPC-7351 Footprint Added.; DatasheetVersion: Oct-1998; PackageVersion: pkg_32, Aug-2005; PackageReference: PQFP128; Publisher: Altium Limited; PackageDescription: 128-Pin Quad Flat Pack 0.8 mm Pitch; Code_IPC: QFP80P3120X3120-128; ComponentLink1Description: Manufacturer Link; ComponentLink1URL: http://www.latticesemi.com/products/mature/index.cfm; ComponentLink2Description: Datasheet; ComponentLink2URL: http://www.latticesemi.com/lit/docs/datasheets/cpld/1048e.pdf
footprint PQFP128_N (QFP, 128-Leads, Body 28x28mm, Pitch 0.8mm, IPC Medium Density)
footprint PQFP128_L (QFP, 128-Leads, Body 28x28mm, Pitch 0.8mm, IPC High Density)
footprint PQFP128_M (QFP, 128-Leads, Body 28x28mm, Pitch 0.8mm, IPC Low Density)
3D model 1048E-PQFP128 (128-Pin Quad Flat Pack 0.8 mm Pitch)
pins: 1 GND (power), 2 I/O84 (io), 3 I/O85 (io), 4 I/O86 (io), 5 I/O87 (io), 6 I/O88 (io), 7 I/O89 (io), 8 I/O90 (io), 9 I/O91 (io), 10 I/O92 (io), 11 I/O93 (io), 12 I/O94 (io), 13 I/O95 (io), 14 IN11 (in), 15 Y0 (in), 16 VCC (power), 17 GND (power), 18 ~{ispEN} (in), 19 ~{RESET} (in), 20 SDI/IN0 (in), 21 I/O0 (io), 22 I/O1 (io), 23 I/O2 (io), 24 I/O3 (io), 25 I/O4 (io), 26 I/O5 (io), 27 I/O6 (io), 28 I/O7 (io), 29 I/O8 (io), 30 I/O9 (io), 31 I/O10 (io), 32 I/O11 (io), 33 GND (power), 34 I/O12 (io), 35 I/O13 (io), 36 I/O14 (io), 37 I/O15 (io), 38 I/O16 (io), 39 I/O17 (io), 40 I/O18 (io), 41 I/O19 (io), 42 I/O20 (io), 43 I/O21 (io), 44 I/O22 (io), 45 I/O23 (io), 46 MODE/IN1 (in), 47 IN2 (in), 48 VCC (power), 49 GND (power), 50 SDO/IN3 (io), 51 IN4 (in), 52 I/O24 (io), 53 I/O25 (io), 54 I/O26 (io), 55 I/O27 (io), 56 I/O28 (io), 57 I/O29 (io), 58 I/O30 (io), 59 I/O31 (io), 60 I/O32 (io), 61 I/O33 (io), 62 I/O34 (io), 63 I/O35 (io), 64 GOE0 (in), 65 GND (power), 66 I/O36 (io), 67 I/O37 (io), 68 I/O38 (io), 69 I/O39 (io), 70 I/O40 (io), 71 I/O41 (io), 72 I/O42 (io), 73 I/O43 (io), 74 I/O44 (io), 75 I/O45 (io), 76 I/O46 (io), 77 I/O47 (io), 78 SCLK/IN5 (in), 79 Y3 (in), 80 Y2 (in), 81 GND (power), 82 VCC (power), 83 Y1 (in), 84 IN6 (in), 85 I/O48 (io), 86 I/O49 (io), 87 I/O50 (io), 88 I/O51 (io), 89 I/O52 (io), 90 I/O53 (io), 91 I/O54 (io), 92 I/O55 (io), 93 I/O56 (io), 94 I/O57 (io), 95 I/O58 (io), 96 I/O59 (io), 97 GND (power), 98 I/O60 (io), 99 I/O61 (io), 100 I/O62 (io), 101 I/O63 (io), 102 I/O64 (io), 103 I/O65 (io), 104 I/O66 (io), 105 I/O67 (io), 106 I/O68 (io), 107 I/O69 (io), 108 I/O70 (io), 109 I/O71 (io), 110 IN7 (in), 111 IN8 (in), 112 GND (power), 113 VCC (power), 114 GOE1 (in), 115 IN9 (in), 116 IN10 (in), 117 I/O72 (io), 118 I/O73 (io), 119 I/O74 (io), 120 I/O75 (io), 121 I/O76 (io), 122 I/O77 (io), 123 I/O78 (io), 124 I/O79 (io), 125 I/O80 (io), 126 I/O81 (io), 127 I/O82 (io), 128 I/O83 (io)